# Altium footprint library BARKO_PCBLIB.PcbLib: 531 footprints (part 14 of 34)
Each footprint in its own frame and in the unit in brackets; x right, y up, seen from the top. Pads: shape width x height; smd on the part's side, far side on the other; paste and mask are expansions set on the pad; w line width, h text height; cw(c..) or ccw(c..) is an arc to the next point about the centre after c.
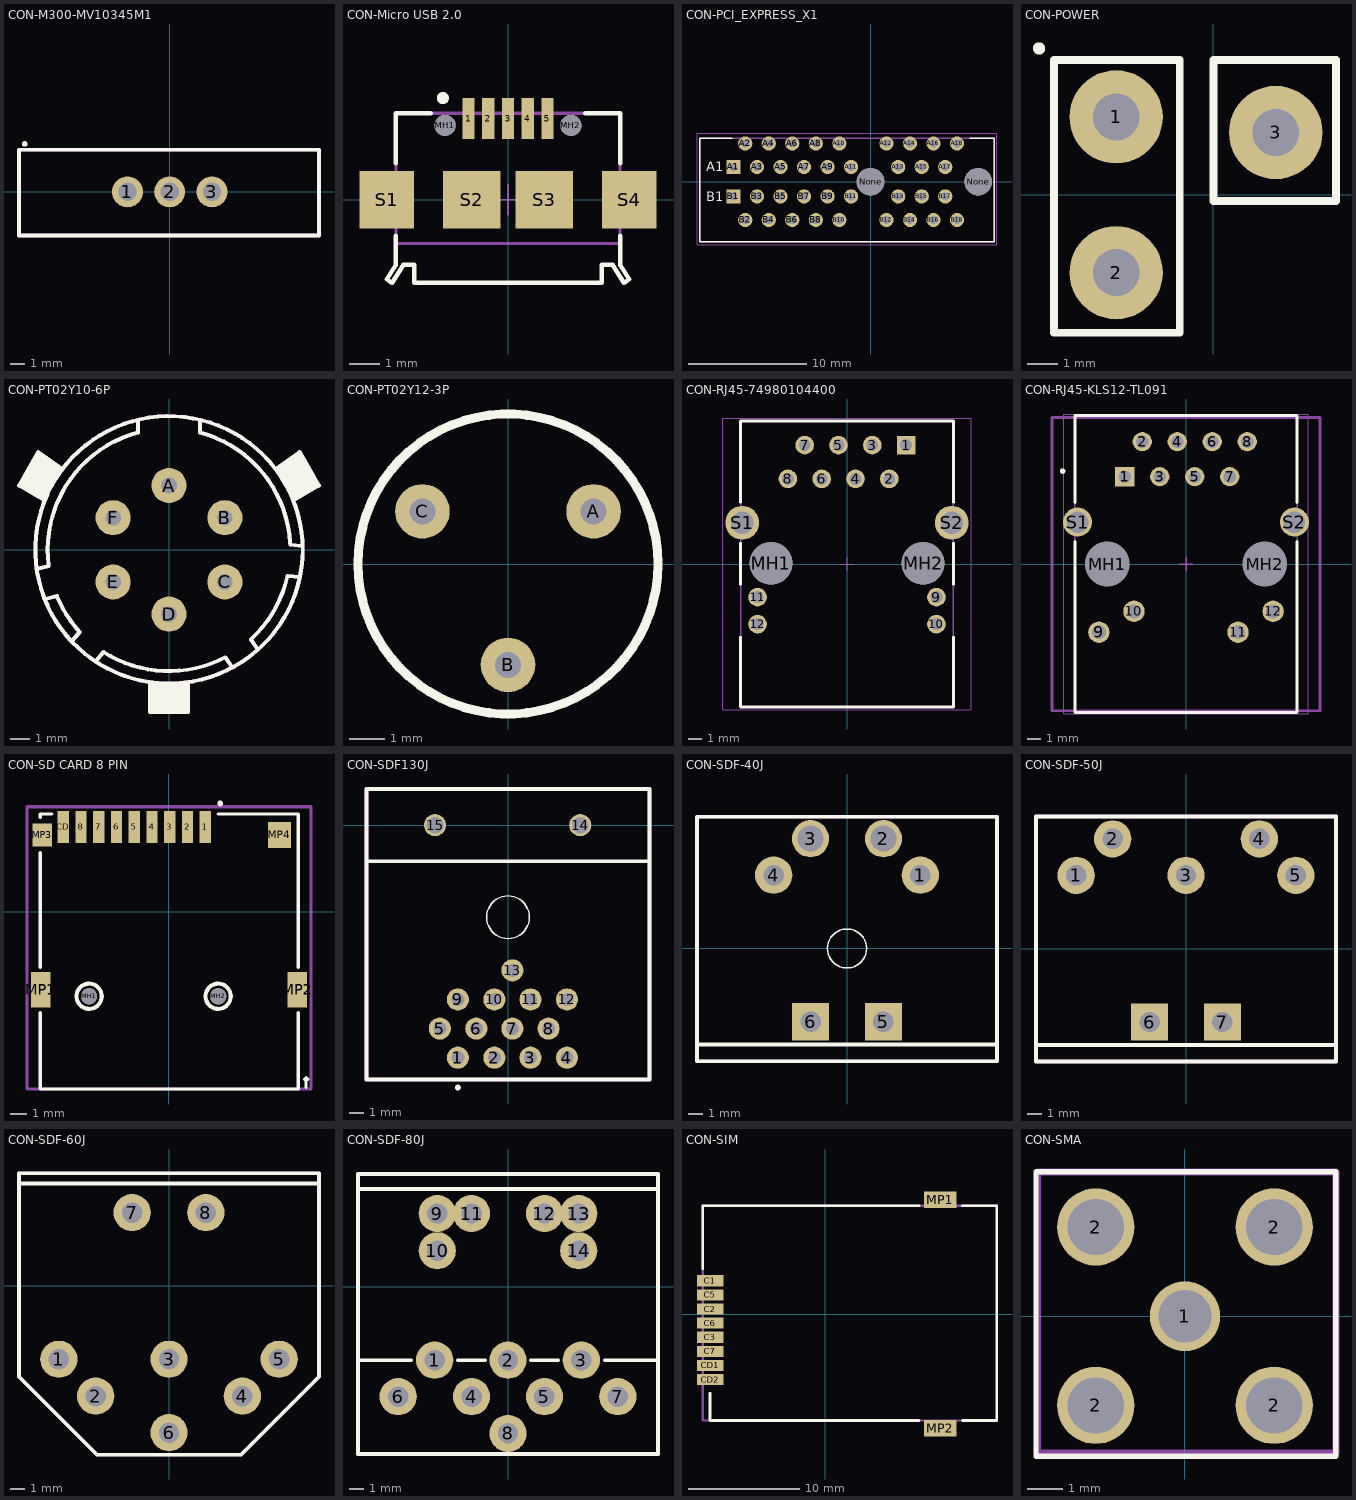
[diagram p13: the footprints below, top view; thin cyan lines are the x and y axes]

## CON-M300-MV10345M1 [mm]
pads (3):
  round 2.2 hole 1.3: 1(-3,0) 2(0,0) 3(3,0)
Top Overlay:
  circle w0.2: c-10.287,3.404 r0.1
  lines w0.254: -10.7,-3.1 10.6,-3.1 10.6,3 -10.7,3 -10.7,-3.1
ASM Top:
  lines w0.254: -10.7,-3.1 -10.7,3 10.6,3 10.6,-3.1 -10.7,-3.1
  text ".designator" at -7.1,-0.5 h0.8
3D body "m300-mv10345m1_asm.stp": height 7, standoff -3.2, extent -10.7,-3 10.6,3

## CON-Micro USB 2.0 [mm] "Micro USB 2.0 SMT Type B Horizontal 5 Contacts"
height 3
pads (11):
  rect 0.4x1.35 smd: 1(-1.3,2.675) 2(-0.65,2.675) 3(0,2.675) 4(0.65,2.675) 5(1.3,2.675)
  round 0.7 hole 0.7 unplated: MH1(-2.075,2.45) MH2(2.075,2.45)
  rect 1.8x1.9 smd: S1(-4,0) S4(4,0)
  rect 1.9x1.9 smd: S2(-1.2,0) S3(1.2,0)
Top Overlay:
  circle w0.2: c-2.15,3.35 r0.1
  lines w0.15: -3.7,-1.2 -3.7,-2.15 -4,-2.625 -3.825,-2.75 -3.45,-2.15 -3.1,-2.15 -3.1,-2.75 3.1,-2.75 3.1,-2.15 3.45,-2.15 3.825,-2.75 4,-2.625 3.7,-2.15 3.7,-1.2 ; -3.7,1.2 -3.7,2.85 -2.55,2.85 ; 2.55,2.85 3.7,2.85 3.7,1.2
Dimensions:
  lines w0.1: -3.7,-1.45 3.7,-1.45
  text "PCB Edge" at -1.2,-2.1 h0.41
Mechanical 15:
  lines w0.05: -0.5,0 0.5,0 ; 0,-0.5 0,0.5
ASM Top:
  lines w0.1: -1.425,2.85 -1.425,3.15 -1.175,3.15 -1.175,2.85 ; -0.775,2.85 -0.775,3.15 -0.525,3.15 -0.525,2.85 ; -0.125,2.85 -0.125,3.15 0.125,3.15 0.125,2.85 ; 0.525,2.85 0.525,3.15 0.775,3.15 0.775,2.85 ; 1.175,2.85 1.175,3.15 1.425,3.15 1.425,2.85 ; -4,-2.625 -3.825,-2.75 -3.45,-2.15 -3.1,-2.15 -3.1,-2.75 3.1,-2.75 3.1,-2.15 3.45,-2.15 3.825,-2.75 4,-2.625 3.7,-2.15 3.7,2.85 -3.7,2.85 -3.7,-2.15 -4,-2.625
  text ".designator" at -0.65,0 h0.8
3D body "629105136821.stp": height 2.69, standoff -0.61, extent -4,-2.73 4,3.173

## CON-PCI_EXPRESS_X1 [mm]
pads (38):
  rect 1.208x1.208 hole 0.7: A1(-11.65,1.25) B1(-11.65,-1.25)
  round 1.208 hole 0.7: A2(-10.65,3.25) A3(-9.65,1.25) A4(-8.65,3.25) A5(-7.65,1.25) A6(-6.65,3.25) A7(-5.65,1.25) A8(-4.65,3.25) A9(-3.65,1.25) A10(-2.65,3.25) A11(-1.65,1.25) A12(1.35,3.25) A13(2.35,1.25) A14(3.35,3.25) A15(4.35,1.25) A16(5.35,3.25) A17(6.35,1.25) A18(7.35,3.25) B2(-10.65,-3.25) B3(-9.65,-1.25) B4(-8.65,-3.25) B5(-7.65,-1.25) B6(-6.65,-3.25) B7(-5.65,-1.25) B8(-4.65,-3.25) B9(-3.65,-1.25) B10(-2.65,-3.25) B11(-1.65,-1.25) B12(1.35,-3.25) B13(2.35,-1.25) B14(3.35,-3.25) B15(4.35,-1.25) B16(5.35,-3.25) B17(6.35,-1.25) B18(7.35,-3.25)
  round 2.35 hole 2.35 unplated: None(0,0) None(9.15,0)
Top Overlay:
  lines w0.127: -11.75,3.7 -14.5,3.7 -14.5,-5.1 10.5,-5.1 10.5,3.7 8.45,3.7
  text "A1" at -13.97,0.889 h0.81
  text "B1" at -13.97,-1.651 h0.81
Bottom 3D Body:
  lines w0.127: -14.5,-5.1 10.5,-5.1 ; -14.5,-5.1 -14.5,3.7 ; -14.5,-5.1 10.5,-5.1 ; -14.5,-5.1 -14.5,3.7 ; -14.5,3.7 10.5,3.7 ; -14.5,3.7 10.5,3.7 ; 10.5,-5.1 10.5,3.7 ; 10.5,-5.1 10.5,3.7
Mechanical 16:
  lines w0.05: -14.75,-5.35 10.75,-5.35 10.75,4.11 -14.75,4.11 -14.75,-5.35
3D body "10018784-10210TLF.step": height 11, standoff -4.4, extent -14.627,-5.1 10.373,3.7

## CON-POWER [mil]
pads (3):
  round 120 hole 60: 1(-125,100) 2(-125,-100) 3(80,80)
Top Overlay:
  circle w7.87: c-224,188 r3.94
  lines w10: -204.72,-177.17 -43.31,-177.17 -43.31,173.23 -204.72,173.23 -204.72,-177.17 ; 0,-7.87 157.48,-7.87 157.48,173.23 0,173.23 0,-7.87

## CON-PT02Y10-6P [mm]
pads (6):
  round 1.8 hole 0.8: A(0,3.3) B(2.87,1.65) C(2.87,-1.65) D(0,-3.3) E(-2.87,-1.65) F(-2.87,1.65)
Top Overlay:
  circle w0.2: c0,0 r6.86
  region: -0.99,-6.788 -0.99,-8.315 0.99,-8.315 0.99,-6.789
  region: 6.706,5.015 5.471,4.137 6.373,2.538 7.696,3.301
  region: -6.706,5.015 -7.696,3.301 -6.374,2.535 -5.471,4.137
  lines w0.2: -6.788,-0.991 -6.17,-0.826 ; -6.374,-2.537 -5.756,-2.371 ccw(c0,0) -4.581,-4.215 -4.992,-4.705 ; -6.374,2.535 -7.696,3.301 -6.706,5.015 -5.471,4.137 ; -6.168,-0.838 cw(c0,0) -1.6,6.015 ; -3.767,-5.734 -3.355,-5.244 ccw(c0,0) 2.885,-5.516 3.252,-6.04 ; -1.6,6.015 -1.6,6.67 ; -0.99,-6.788 -0.99,-8.315 0.99,-8.315 0.99,-6.789 ; 1.6,6.015 cw(c0,0) 6.215,0.347 ; 1.6,6.015 1.6,6.67 ; 4.563,-5.123 4.196,-4.599 ccw(c0,0) 6.067,-1.391 ; 5.471,4.137 6.706,5.015 7.696,3.301 6.373,2.538 ; 6.08,-1.336 6.717,-1.391 ; 6.219,0.258 6.857,0.203
ASM Top:
  circle w0.2: c0,0 r6.86
  region: -6.706,5.016 -7.696,3.301 -6.374,2.536 -5.471,4.138
  region: 6.706,5.016 5.471,4.138 6.373,2.538 7.696,3.301
  region: -0.99,-6.788 -0.99,-8.314 0.99,-8.314 0.99,-6.788
  lines w0.2: -6.788,-0.991 -6.17,-0.825 ; -6.374,-2.536 -5.756,-2.371 ccw(c0,0) -4.581,-4.215 -4.992,-4.705 ; -6.374,2.536 -7.696,3.301 -6.706,5.016 -5.471,4.138 ; -6.168,-0.838 cw(c0,0) -1.6,6.016 -1.6,6.671 ; -3.767,-5.733 -3.355,-5.243 ccw(c0,0) 2.886,-5.516 3.253,-6.04 ; -0.99,-6.788 -0.99,-8.314 0.99,-8.314 0.99,-6.788 ; 1.6,6.671 1.6,6.016 cw(c0,0) 6.215,0.348 ; 4.563,-5.122 4.196,-4.598 ccw(c0,0) 6.068,-1.391 ; 5.471,4.138 6.706,5.016 7.696,3.301 6.373,2.538 ; 6.08,-1.335 6.717,-1.391 ; 6.22,0.259 6.857,0.203
  text ".designator" at -0.914,-0.178 h0.8
3D body "45102E - PT02A size 10.STEP": height 23, standoff -2.06, extent -11.9,-11.9 11.9,11.908

## CON-PT02Y12-3P [mm]
pads (3):
  round 1.524 hole 0.72: A(2.39,1.47) B(0,-2.82) C(-2.39,1.47)
Top Overlay:
  circle w0.254: c0,0 r4.191
ASM Top:
  circle w0.2: c0,0 r4.191
  text ".designator" at -0.203,-0.025 h0.8

## CON-RJ45-74980104400 [mm] "10/100Base-T, THT, 1x1, Tab up, w/o shield tabs, LED L-R yellow-green/yellow-green, THR"
height 13.85
pads (16):
  rect 1.4x1.4 hole 0.89: 1(4.44,8.94)
  round 1.4 hole 0.89: 2(3.18,6.4) 3(1.9,8.94) 4(0.64,6.4) 5(-0.64,8.94) 6(-1.9,6.4) 7(-3.18,8.94) 8(-4.44,6.4) 9(6.725,-2.49) 10(6.725,-4.52) 11(-6.725,-2.49) 12(-6.725,-4.52)
  round 3.2 hole 3.2 unplated: MH1(-5.715,0.05) MH2(5.715,0.05)
  round 2.55 hole 1.7: S1(-7.875,3.1) S2(7.875,3.1)
Top Overlay:
  lines w0.2: -8,-5.5 -8,-10.75 8,-10.75 8,-5.5 ; -8,-1.51 -8,1.55 ; -8,4.65 -8,10.75 8,10.75 8,4.65 ; 8,-1.51 8,1.55
Top Paste:
  region: -3.33,7.5 -5.53,7.5 -5.53,4.7 -3.33,4.7
  region: -0.79,7.5 -2.99,7.5 -2.99,4.7 -0.79,4.7
  region: 1.75,7.5 -0.45,7.5 -0.45,4.7 1.75,4.7
  region: 4.29,7.5 2.09,7.5 2.09,4.7 4.29,4.7
  region: -2.07,7.84 -4.27,7.84 -4.27,10.64 -2.07,10.64
  region: 5.55,7.84 3.35,7.84 3.35,10.64 5.55,10.64
  region: 3.01,7.84 0.81,7.84 0.81,10.64 3.01,10.64
  region: 0.47,7.84 -1.73,7.84 -1.73,10.64 0.47,10.64
  region: -4.475,1.8 -11.275,1.8 -11.275,4.4 -4.475,4.4
  region: 11.275,1.8 4.475,1.8 4.475,4.4 11.275,4.4
  region: -8.625,-3.29 -4.825,-3.29 -4.825,-1.69 -8.625,-1.69
  region: 8.625,-3.29 4.825,-3.29 4.825,-1.69 8.625,-1.69
  region: -8.625,-5.32 -4.825,-5.32 -4.825,-3.72 -8.625,-3.72
  region: 8.625,-5.32 4.825,-5.32 4.825,-3.72 8.625,-3.72
Dimensions:
  text "The stencil layout appplied for / PCB 1.6mm and Stencil 0.15mm" at -9.47,-15.04 h1.02
Mechanical 15:
  lines w0.05: -0.5,0 0.5,0 ; 0,-0.5 0,0.5 ; -9.35,-10.95 -9.35,10.95 9.35,10.95 9.35,-10.95 -9.35,-10.95
ASM Top:
  lines w0.1: -8,-10.75 8,-10.75 8,10.75 -8,10.75 -8,-10.75
  text ".designator" at -0.244,0 h0.8
3D body "74980104400.stp": height 13.7, standoff -3, extent -8.06,-10.75 8.06,10.75

## CON-RJ45-KLS12-TL091 [mm] "MagJack, 14-Leads, Body 21.59x16.13mm"
height 13.84
pads (16):
  rect 1.4x1.4 hole 0.89: 1(-4.445,6.35)
  round 1.4 hole 0.89: 2(-3.175,8.89) 3(-1.905,6.35) 4(-0.635,8.89) 5(0.635,6.35) 6(1.905,8.89) 7(3.175,6.35) 8(4.445,8.89)
  round 1.55 hole 1.02: 9(-6.325,-4.95) 10(-3.78,-3.43) 11(3.78,-4.95) 12(6.325,-3.43)
  round 2.95 hole 3.25 unplated: MH1(-5.715,0) MH2(5.715,0)
  round 2.1 hole 1.57: S1(-7.875,3.05) S2(7.875,3.05)
Top Overlay:
  circle w0.2: c-8.966,6.756 r0.1
  lines w0.2: -8.065,1.636 -8.065,-10.79 8.065,-10.79 8.065,1.636 ; -8.065,4.464 -8.065,10.8 8.065,10.8 8.065,4.464
Mechanical 13:
  lines w0.1: -8.065,-10.79 -8.065,10.8 8.065,10.8 8.065,-10.79 -8.065,-10.79
Mechanical 15:
  lines w0.05: -8.895,-10.89 -8.895,10.9 8.895,10.9 8.895,-10.89 -8.895,-10.89
  lines w0.1: -0.5,0 0.5,0 ; 0,-0.5 0,0.5
ASM Top:
  lines w0.2: -9.724,-10.65 -9.724,10.65 9.724,10.65 9.724,-10.65 -9.724,-10.65
  text ".designator" at -0.5,0 h0.8
3D body "74990111217_Download_STP_74990111217_rev1.stp": height 15.29, standoff -3.14, extent -9.724,-10.65 9.724,10.65

## CON-SD CARD 8 PIN [mm]
pads (15):
  rect 0.7x2 smd: 1(2.25,5.25) 2(1.15,5.25) 3(0.05,5.25) 4(-1.05,5.25) 5(-2.15,5.25) 6(-3.25,5.25) 7(-4.35,5.25) 8(-5.45,5.25) CD(-6.55,5.25)
  round 1 hole 1 unplated: MH1(-4.95,-5.25) MH2(3.05,-5.25)
  rect 1.2x2.2 smd: MP1(-7.95,-4.85) MP2(7.95,-4.85)
  rect 1.2x1.4 smd: MP3(-7.85,4.75)
  rect 1.4x1.6 smd: MP4(6.85,4.75)
Top Overlay:
  circle w0.254: c-4.95,-5.25 r0.781
  circle w0.254: c3.05,-5.25 r0.781
  circle w0.254: c3.172,6.705 r0.05
  lines w0.2: -7.987,-6.25 -7.987,-11 8.013,-11 8.013,-6.25 ; -7.987,-3.45 -7.987,3.65 ; -7.987,5.85 -7.987,6.05 -7.25,6.05 ; 3.05,6.05 8.013,6.05 8.013,-3.45 ; 8.4,-10.4 8.5,-10.3 ; 8.5,-10.9 8.5,-10.3 ; 8.6,-10.4 8.5,-10.3
ASM Top:
  lines w0.2: -8.8,-11 8.8,-11 8.8,6.5 -8.8,6.5 -8.8,-11
  text ".designator" at -2.1,-3 h0.8
3D body "User Library-Socket-MicroSD.step": height 1.86, standoff -0.59, extent -8,-11.05 8,6

## CON-SDF130J [mil]
pads (15):
  round 60 hole 35: 1(-136,-631) 2(-37,-631) 3(61,-631) 4(160,-631) 5(-185,-552) 6(-86,-552) 7(12,-552) 8(110,-552) 9(-136,-473) 10(-37,-473) 11(61,-473) 12(160,-473) 13(12,-394)
  round 60 hole 45: 14(196,0) 15(-198,0)
Top Overlay:
  circle w7.87: c-136,-712 r3.94
  circle w4: c0,-250 r58.01
  lines w10: -384,-98 384,-98 ; -384,-690 -384,98 384,98 384,-690 -384,-690
ASM Top:
  lines w10: -384,-690 -384,98.03 383.72,98.03 383.72,-690 -384,-690
  text ".designator" at -293,-290 h31.5
3D body "CUI_INC_SDF-130J.step": height 787.9, standoff -133.36, extent -384,-650 383.72,98.03

## CON-SDF-40J [mil]
pads (6):
  round 100 hole 55: 1(197,197) 4(-197,197)
  round 100 hole 70: 2(98,295) 3(-98,295)
  rect 100x100 hole 55: 5(98,-197) 6(-98,-197)
Top Overlay:
  circle w4: c0,0 r52.48
  lines w10: -403,-258 403,-258 ; -403,-303 403,-303 403,354 -403,354 -403,-303
ASM Top:
  lines w10: -403,-303 403,-303 403,354 -403,354 -403,-303
  text ".designator" at -294,21 h31.5
3D body "CUI_INC_SDF-40J.step": height 843.02, standoff -137.29, extent -404,-302 410.96,327.92
3D body: height 10, standoff 0, extent -12,120 -12,120

## CON-SDF-50J [mil]
pads (7):
  round 100 hole 55: 1(-295,197) 2(-197,295) 3(0,197) 4(197,295) 5(295,197)
  rect 100x100 hole 55: 6(-98,-197) 7(98,-197)
Top Overlay:
  lines w10: -403,-259 403,-259 ; -403,-303 -403,355 403,355 403,-303 -403,-303
ASM Top:
  lines w10: -403,-303 -403,355 403,355 403,-303 -403,-303
  text ".designator" at -295,18 h31.5
3D body "CUI_INC_SDF-50J.step": height 843.02, standoff -137.29, extent -408,-301.11 406.96,317

## CON-SDF-60J [mil]
pads (8):
  round 100 hole 55: 1(-296,-197) 2(-197,-296) 3(0,-197) 4(197,-296) 5(296,-197) 6(0,-394) 7(-99,197) 8(99,197)
Top Overlay:
  lines w10: -403,275 403,275 ; -403,-244 -193,-454 193,-454 403,-244 403,303 -403,303 -403,-244
ASM Top:
  lines w10: -403,-244 -193,-454 193,-454 403,-244 403,303 -403,303 -403,-244
  text ".designator" at -348,-17 h31.5
3D body "CUI_INC_SDF-60J.step": height 843.02, standoff -137.29, extent -408,-401.69 406.96,305

## CON-SDF-80J [mil]
pads (14):
  round 100 hole 55: 1(-197,-197) 2(0,-197) 3(197,-197) 4(-98,-295) 5(98,-295) 6(-295,-295) 7(295,-295) 8(0,-394) 9(-190,197) 10(-190,97) 11(-98,197) 12(98,197) 13(190,197) 14(190,97)
Top Overlay:
  lines w10: -403,-197 -260,-197 ; -403,263 403,263 ; -135,-197 -61,-197 ; 62,-197 135,-197 ; 260,-197 403,-197 ; -403,-449 403,-449 403,303 -403,303 -403,-449
ASM Top:
  lines w10: -403,-449 -403,303 -394,303 403,303 403,-449 -403,-449
  text ".designator" at -234,-23 h31.5
3D body "CUI_INC_SDF-80J.step": height 843.02, standoff -137.29, extent -407.96,-438 407,300.19

## CON-SIM [mm] "MOLEX:0475530001,KLS:693013050811"
height 1.8
pads (10):
  rect 2.4x1 smd mask+0.2: C1(-10.35,2.995) C2(-10.349,0.445) C3(-10.349,-2.095) C5(-10.349,1.715) C6(-10.349,-0.825) C7(-10.349,-3.365) CD1(-10.349,-4.635) CD2(-10.349,-5.905)
  rect 2.95x1.5 smd mask+0.2: MP1(10.35,10.275) MP2(10.35,-10.275)
Top Overlay:
  lines w0.254: -11.03,4.105 -11.03,5.56 ; -10.383,-7.135 -10.383,-9.6 8.45,-9.6 ; 8.45,9.75 -11.029,9.75 -11.029,5.559 ; 12.35,-9.6 15.451,-9.6 15.451,9.75 12.35,9.75 ; -11.03,5.56 -11.029,5.559
ASM Top:
  lines w0.2: -11.029,-9.6 -11.029,9.75 15.47,9.75 15.47,-9.581 15.451,-9.6 -11.029,-9.6 ; -11.029,-9.6 -11.029,-9.6
  text ".designator" at 0,0 h0.8
3D body "475530001.stp": height 1.81, standoff -0.02, extent -11.029,-10.4 15.471,10.55

## CON-SMA [mm]
pads (5):
  round 2 hole 1.5: 1(0,0)
  round 2.2 hole 1.6: 2(-2.54,-2.54) 2(-2.54,2.54) 2(2.54,-2.54) 2(2.54,2.54)
Top Overlay:
  lines w0.152: -4.242,-3.988 4.293,-3.988 4.293,4.115 -4.242,4.115 -4.242,-3.988
ASM Top:
  lines w0.2: -4.2,-3.9 4.3,-3.9 4.3,4.1 -4.2,4.1 -4.2,-3.9
  text ".designator" at -0.3,-0.1 h0.8
3D body "sma.STEP": height 9.55, standoff -3.9, extent -3.155,-3.155 3.155,3.155